# Altium footprint library HLib_footprint_Hien.PcbLib: 58 footprints (part 4 of 4)
Each footprint in its own frame and in the unit in brackets; x right, y up, seen from the top. Pads: shape width x height; smd on the part's side, far side on the other; paste and mask are expansions set on the pad; w line width, h text height; cw(c..) or ccw(c..) is an arc to the next point about the centre after c.
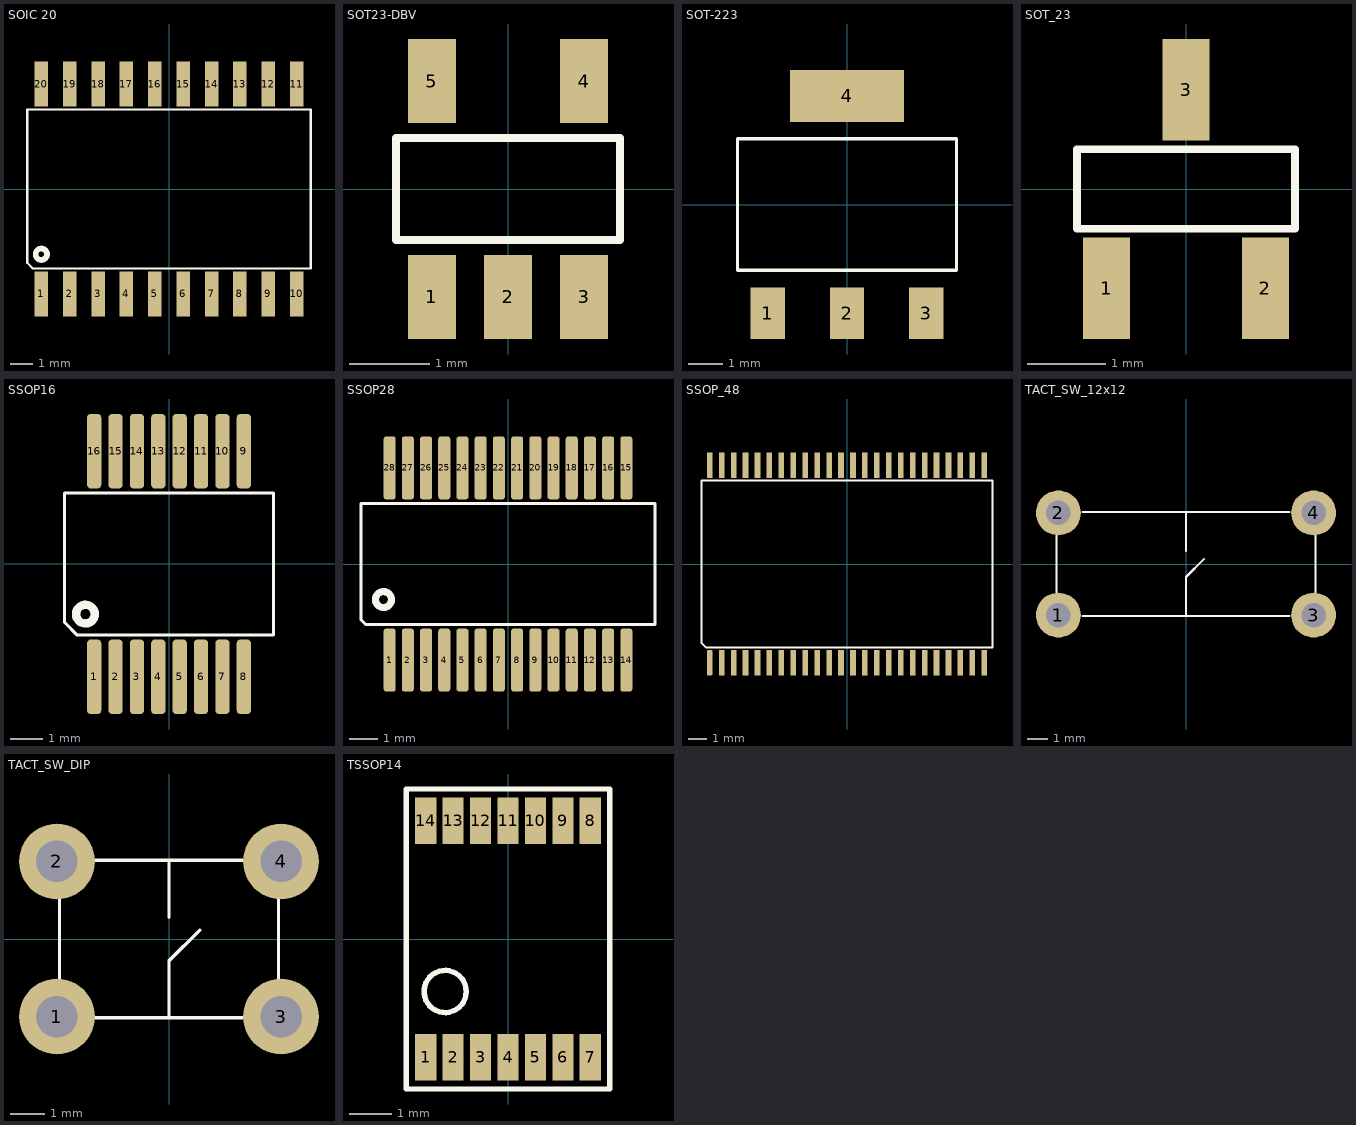
[diagram p3: the footprints below, top view; thin cyan lines are the x and y axes]

## SOIC 20 [mm]
pads (20):
  rect 0.6x2 smd: 1(-5.715,-4.7) 2(-4.445,-4.7) 3(-3.175,-4.7) 4(-1.905,-4.7) 5(-0.635,-4.7) 6(0.635,-4.7) 7(1.905,-4.7) 8(3.175,-4.7) 9(4.445,-4.7) 10(5.715,-4.7) 11(5.715,4.7) 12(4.445,4.7) 13(3.175,4.7) 14(1.905,4.7) 15(0.635,4.7) 16(-0.635,4.7) 17(-1.905,4.7) 18(-3.175,4.7) 19(-4.445,4.7) 20(-5.715,4.7)
Top Overlay:
  circle w0.254: c-5.715,-2.921 r0.254
  lines w0.1: -6.35,-3.302 -6.096,-3.556 6.35,-3.556 6.35,3.556 -6.35,3.556 -6.35,-3.302
3D body: height 2.2, standoff -0.04, extent -6.3,-5.067 6.3,5.067

## SOT23-DBV [mm] "5 pins SMD"
pads (5):
  rect 0.6x1.05 smd: 1(-0.95,-1.35) 2(0,-1.35) 3(0.95,-1.35) 4(0.95,1.35) 5(-0.95,1.35)
Top Overlay:
  lines w0.1: -1.397,-0.635 1.397,-0.635 1.397,0.635 -1.397,0.635 -1.397,-0.635
3D body: height 1.45, standoff 0, extent -1.45,-1.4 1.45,1.4

## SOT-223 [mm]
pads (4):
  rect 1x1.5 smd: 1(-2.3,-3.15) 2(0,-3.15) 3(2.3,-3.15)
  rect 3.3x1.5 smd: 4(0,3.15)
Top Overlay:
  lines w0.1: -3.175,-1.905 -3.175,1.905 3.175,1.905 3.175,-1.905 -3.175,-1.905
3D body: height 1.85, standoff -0.01, extent -3.198,-3.5 3.302,3.5

## SOT_23 [mm]
pads (3):
  rect 0.6x1.3 smd: 1(-1.016,-1.27) 2(1.016,-1.27) 3(0,1.27)
Top Overlay:
  lines w0.1: -1.397,-0.508 -1.397,0.508 1.397,0.508 1.397,-0.508 -1.397,-0.508
3D body: height 1.1, standoff 0, extent -1.5,-1.272 1.5,1.27

## SSOP16 [mm]
pads (16):
  rrect50% 0.432x2.261 smd: 1(-2.275,-3.429) 2(-1.625,-3.429) 3(-0.975,-3.429) 4(-0.325,-3.429) 5(0.325,-3.429) 6(0.975,-3.429) 7(1.625,-3.429) 8(2.275,-3.429) 9(2.275,3.429) 10(1.625,3.429) 11(0.975,3.429) 12(0.325,3.429) 13(-0.325,3.429) 14(-0.975,3.429) 15(-1.625,3.429) 16(-2.275,3.429)
Top Overlay:
  circle w0.254: c-2.54,-1.524 r0.284
  lines w0.1: -3.175,-1.778 -3.175,2.159 3.175,2.159 3.175,-2.159 -2.794,-2.159 -3.175,-1.778

## SSOP28 [mm] "SOP, 28 leads, 10.5x5.6mm"
pads (28):
  rrect50% 0.432x2.261 smd: 1(-4.225,-3.429) 2(-3.575,-3.429) 3(-2.925,-3.429) 4(-2.275,-3.429) 5(-1.625,-3.429) 6(-0.975,-3.429) 7(-0.325,-3.429) 8(0.325,-3.429) 9(0.975,-3.429) 10(1.625,-3.429) 11(2.275,-3.429) 12(2.925,-3.429) 13(3.575,-3.429) 14(4.225,-3.429) 15(4.225,3.429) 16(3.575,3.429) 17(2.925,3.429) 18(2.275,3.429) 19(1.625,3.429) 20(0.975,3.429) 21(0.325,3.429) 22(-0.325,3.429) 23(-0.975,3.429) 24(-1.625,3.429) 25(-2.275,3.429) 26(-2.925,3.429) 27(-3.575,3.429) 28(-4.225,3.429)
Top Overlay:
  circle w0.254: c-4.445,-1.27 r0.284
  lines w0.1: -5.25,-1.989 -5.08,-2.159 5.25,-2.159 5.25,2.159 -5.25,2.159 -5.25,-1.989
3D body: height 1.97, standoff -0.03, extent -5.1,-3.906 5.1,3.906

## SSOP_48 [mm] "SOT370-1"
pads (48):
  rrect50% 0.3x1.35 smd: 1(-7.302,-5.25)
  rect 0.3x1.35 smd: 2(-6.667,-5.25) 3(-6.032,-5.25) 4(-5.397,-5.25) 5(-4.763,-5.25) 6(-4.127,-5.25) 7(-3.493,-5.25) 8(-2.857,-5.25) 9(-2.222,-5.25) 10(-1.587,-5.25) 11(-0.953,-5.25) 12(-0.318,-5.25) 13(0.318,-5.25) 14(0.953,-5.25) 15(1.587,-5.25) 16(2.222,-5.25) 17(2.857,-5.25) 18(3.492,-5.25) 19(4.127,-5.25) 20(4.763,-5.25) 21(5.397,-5.25) 22(6.032,-5.25) 23(6.667,-5.25) 24(7.302,-5.25) 25(7.302,5.25) 26(6.667,5.25) 27(6.032,5.25) 28(5.397,5.25) 29(4.763,5.25) 30(4.127,5.25) 31(3.492,5.25) 32(2.857,5.25) 33(2.222,5.25) 34(1.587,5.25) 35(0.953,5.25) 36(0.318,5.25) 37(-0.318,5.25) 38(-0.953,5.25) 39(-1.587,5.25) 40(-2.222,5.25) 41(-2.857,5.25) 42(-3.493,5.25) 43(-4.127,5.25) 44(-4.763,5.25) 45(-5.397,5.25) 46(-6.032,5.25) 47(-6.667,5.25) 48(-7.302,5.25)
Top Overlay:
  lines w0.1: -7.747,-4.191 -7.747,4.445 7.747,4.445 7.747,-4.445 -7.493,-4.445 -7.747,-4.191
3D body: height 2.65, standoff 0, extent -8.001,-5.2 7.999,5.2

## TACT_SW_12x12 [mm]
pads (4):
  round 2.2 hole 1.2: 1(-6.25,-2.5) 2(-6.25,2.5) 3(6.25,-2.5) 4(6.25,2.5)
Top Overlay:
  lines w0.1: -6.35,-1.397 -6.35,1.397 ; -5.08,-2.54 5.08,-2.54 ; -5.08,2.54 5.08,2.54 ; 0,-2.54 0,-0.635 0.889,0.254 ; 0,0.635 0,2.54 ; 6.35,-1.397 6.35,1.397
3D body: height 7.3, standoff -3.5, extent -6.523,-6 6.477,6

## TACT_SW_DIP [mm]
pads (4):
  round 2.2 hole 1.2: 1(-3.25,-2.25) 2(-3.25,2.25) 3(3.25,-2.25) 4(3.25,2.25)
Top Overlay:
  lines w0.1: -3.175,-1.143 -3.175,1.143 ; -2.159,-2.286 2.159,-2.286 ; -2.159,2.286 2.159,2.286 ; 0,-2.286 0,-0.635 0.889,0.254 ; 0,0.635 0,2.286 ; 3.175,-1.143 3.175,1.143
3D body: height 7, standoff -3.5, extent -4.133,-3.25 4.134,3.25

## TSSOP14 [mm] "Surface-mount footprint TSSOP14"
pads (14):
  rect 0.5x1.1 smd: 1(-1.95,-2.8) 2(-1.3,-2.8) 3(-0.65,-2.8) 4(0,-2.8) 5(0.65,-2.8) 6(1.3,-2.8) 7(1.95,-2.8) 8(1.95,2.8) 9(1.3,2.8) 10(0.65,2.8) 11(0,2.8) 12(-0.65,2.8) 13(-1.3,2.8) 14(-1.95,2.8)
Top Overlay:
  circle w0.127: c-1.491,-1.245 r0.5
  lines w0.127: -2.413,-3.556 2.413,-3.556 2.413,3.556 -2.413,3.556 -2.413,-3.556
3D body: height 1.1, standoff 0, extent -2.5,-3.2 2.5,3.2